# Altium footprint library PCBfly.PcbLib: 32 footprints (part 1 of 2)
Each footprint in its own frame and in the unit in brackets; x right, y up, seen from the top. Pads: shape width x height; smd on the part's side, far side on the other; paste and mask are expansions set on the pad; w line width, h text height; cw(c..) or ccw(c..) is an arc to the next point about the centre after c.
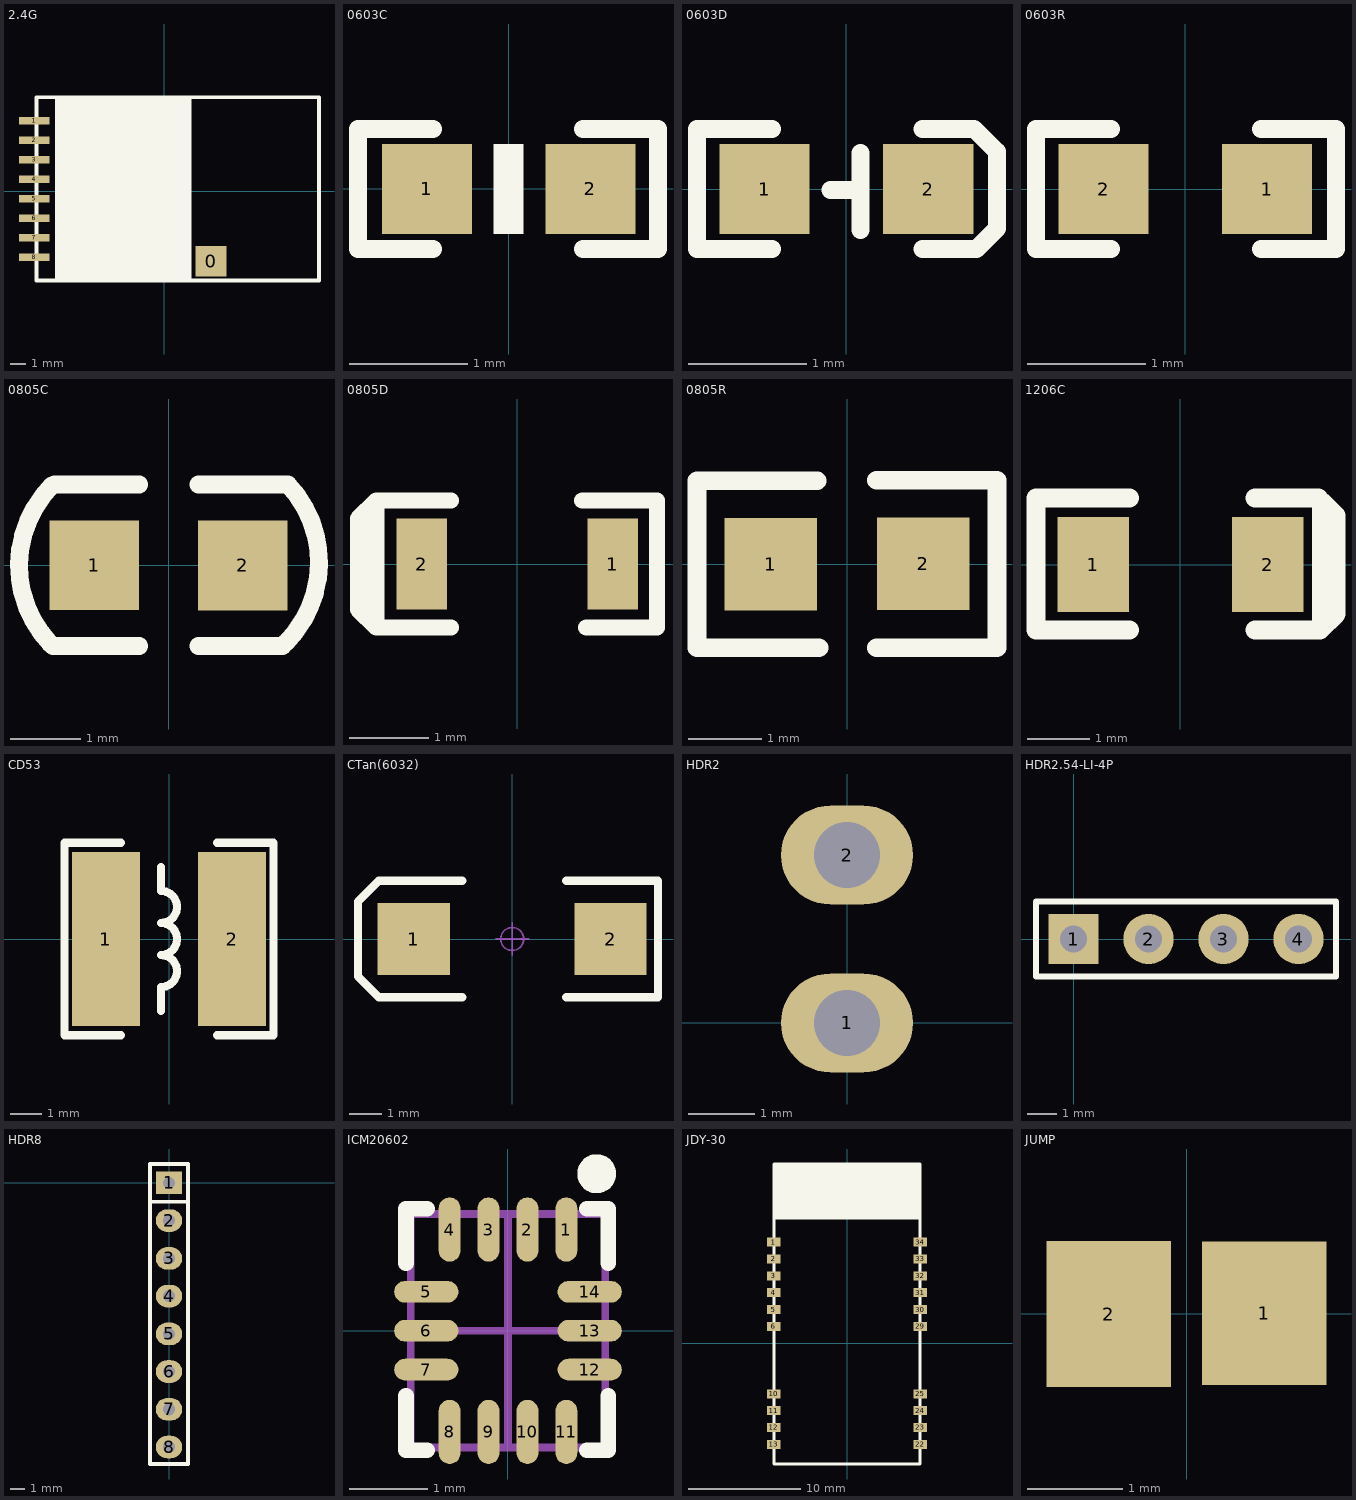
[diagram p0: the footprints below, top view; thin cyan lines are the x and y axes]

## 2.4G [mm]
pads (9):
  rect 2x2 smd: 0(3.048,-4.572)
  rect 2x0.5 smd: 1(-8.46,4.581) 2(-8.46,3.311) 3(-8.46,2.041) 4(-8.46,0.771) 5(-8.46,-0.499) 6(-8.46,-1.769) 7(-8.46,-3.039) 8(-8.46,-4.309)
Top Overlay:
  rectangle: -7.112,-5.842 1.778,6.096
  lines w0.254: -8.333,-5.833 10.082,-5.833 10.082,6.105 -8.333,6.105 -8.333,-5.833
3D body "nrf24l01.step": height 0.8, standoff 0, extent -8.509,-5.817 9.491,6.183

## 0603C [mil]
pads (2):
  rect 30x30 smd: 1(-27.25,0.03) 2(27.25,-0.03)
Top Overlay:
  region: 4.9,-15 4.9,15 -5.1,15 -5.1,-15
  lines w6: -25.25,-20.03 -50.25,-20.03 -50.25,19.97 -25.25,19.97 ; 24.75,-20.03 49.75,-20.03 49.75,19.97 24.75,19.97
3D body "0603 SMD Capacitor.STEP": height 11.89, standoff 0, extent -30.74,-14.6 32.25,16.9

## 0603D [mil]
pads (2):
  rect 30x30 smd: 1(-27.25,0.03) 2(27.25,-0.03)
Top Overlay:
  lines w6: -24.75,-19.97 -49.75,-19.97 -49.75,20.03 -24.75,20.03 ; -5.26,-0.24 2.5,-0.35 ; 4.66,-13.53 4.66,12.06 ; 25.25,-19.97 43.31,-19.97 50.13,-13.14 50.13,12.45 42.55,20.03 25.25,20.03
3D body "16.STEP": height 23.82, standoff -0.04, extent -31.5,-15 31.5,16.58

## 0603R [mil]
pads (2):
  rect 30x30 smd: 1(27.25,-0.03) 2(-27.25,0.03)
Top Overlay:
  lines w6: -24.75,-19.97 -49.75,-19.97 -49.75,20.03 -24.75,20.03 ; 25.25,-19.97 50.25,-19.97 50.25,20.03 25.25,20.03
3D body "RES0603.STEP": height 17.72, standoff 0, extent -27.99,-18 35,14.29

## 0805C [mm]
pads (2):
  rect 1.27x1.27 smd: 1(-1.05,0.001) 2(1.05,-0.001)
Top Overlay:
  lines w0.254: -1.677,-1.108 cw(c-0.511,-0.001) -1.652,1.132 ; -1.64,-1.142 -0.415,-1.142 ; -1.617,1.144 -0.415,1.144 ; 0.423,-1.142 1.617,-1.142 ; 0.423,1.144 1.67,1.144 ; 1.665,-1.092 ccw(c0.524,0.04) 1.693,1.144
3D body "User Library-0805 SMD Capacitor.STEP": height 0.77, standoff -0.01, extent -1.001,-0.621 0.999,0.629

## 0805D [mil]
pads (2):
  rect 25x45 smd: 1(47.19,0) 2(-47.19,0)
Top Overlay:
  lines w8: -74.79,-23.46 -74.79,21.54 ; -32.79,-31.46 -69.79,-31.46 ; -32.79,31.54 -69.79,31.54 ; 32.21,31.54 69.21,31.54 69.21,-31.46 34.21,-31.46 ; -69.79,-31.46 -78.79,-22.46 -78.79,22.54 -69.79,31.54 ; -69.79,-31.46 -69.79,31.54
3D body "SOD323.STEP": height 35.43, standoff -3.54, extent -49,-24.46 49.42,24.75

## 0805R [mm] "1/8W"
pads (2):
  rect 1.27x1.27 smd: 1(-1.045,-0.003) 2(1.045,0.003)
Top Overlay:
  lines w0.254: -0.41,1.14 -2.056,1.14 -2.056,-1.146 -0.385,-1.146 ; 0.403,-1.146 2.054,-1.146 2.054,1.146 0.403,1.146
3D body "R0805.STEP": height 0.55, standoff 0, extent -1.009,-0.622 0.991,0.638

## 1206C [mil]
pads (2):
  rect 45x60 smd: 1(-55,0) 2(55,0)
Top Overlay:
  lines w12: -32,-41.19 -91,-41.19 -91,41.81 -32,41.81 ; 47,-41.19 88,-41.19 98,-31.18 98,30.82 89,39.81 89,-40.19 ; 47,41.81 87,41.81
3D body "3216-_A_钽电容.step": height 70.87, standoff 0, extent -66.93,-33.55 66.93,37.31

## CD53 [mm] "5.8*5.2*3.5mm（长宽高）"
pads (2):
  rect 2.15x5.5 smd: 1(-2,0) 2(2,0)
Top Overlay:
  lines w0.254: -1.524,-3.048 -3.302,-3.048 -3.302,3.048 -1.524,3.048 ; -0.254,-2.286 -0.254,-1.524 ccw(c-0.254,-1.016) -0.254,-0.508 ccw(c-0.254,0) -0.254,0.508 ccw(c-0.254,1.016) -0.254,1.524 -0.254,2.286 ; 1.524,-3.048 3.302,-3.048 3.302,3.048 1.524,3.048
3D body "CD53.STEP": height 3.6, standoff 0, extent -2.874,-2.5 2.874,2.5

## CTan(6032) [mm] "长6.0mm，宽3.2mm，厚2.5mm"
pads (2):
  rect 2.2x2.2 smd: 1(-3,0) 2(3,0)
Top Overlay:
  lines w0.254: -1.524,-1.778 -4.064,-1.778 -4.699,-1.143 -4.699,1.143 -4.064,1.778 -1.524,1.778 ; 1.651,-1.778 4.445,-1.778 4.445,1.778 1.651,1.778
Mechanical 15:
  circle w0.05: c0,0 r0.35
  lines w0.05: -0.5,0 0.5,0 ; 0,-0.5 0,0.5
3D body "CD C(6032).STEP": height 2.5, standoff -0.01, extent -3,-1.6 3,1.6

## HDR2 [mm]
pads (2):
  oval 2x1.5 hole 1: 1(0,0) 2(0,2.54)
3D body "hdr2.stp": height 2.54, standoff -1, extent -0.361,-1.279 9.989,3.801

## HDR2.54-LI-4P [mm] "排针，4脚"
pads (4):
  rect 1.7x1.7 hole 0.9: 1(0,0)
  round 1.7 hole 0.9: 2(2.54,0) 3(5.08,0) 4(7.62,0)
Top Overlay:
  lines w0.2: -1.27,-1.27 8.89,-1.27 8.89,1.27 -1.27,1.27 -1.27,-1.27
3D body "HDR2.54-1P.STEP": height 8.5, standoff -3, extent 6.35,-1.27 8.89,1.27
3D body "HDR2.54-1P.STEP": height 8.5, standoff -3, extent 3.81,-1.27 6.35,1.27
3D body "HDR2.54-1P.STEP": height 8.5, standoff -3, extent 1.27,-1.27 3.81,1.27
3D body "HDR2.54-1P.STEP": height 8.5, standoff -3, extent -1.27,-1.27 1.27,1.27

## HDR8 [mil]
pads (8):
  rect 70x60 hole 32: 1(0,0)
  oval 70x60 hole 32: 2(0,-100) 3(0,-200) 4(0,-300) 5(0,-400) 6(0,-500) 7(0,-600) 8(0,-700)
Top Overlay:
  lines w10: -50,-50 50,-50 ; -50,-745 50,-745 50,50 -50,50 -50,-745
3D body "1001-8.STEP": height 336.22, standoff -118.11, extent -50,-750 50,50

## ICM20602 [mm]
pads (14):
  oval 0.28x0.825 smd mask+0.051: 1(0.75,1.3) 2(0.25,1.3) 3(-0.25,1.3) 4(-0.75,1.3) 8(-0.75,-1.3) 9(-0.25,-1.3) 10(0.25,-1.3) 11(0.75,-1.3)
  oval 0.825x0.28 smd mask+0.051: 5(-1.05,0.5) 6(-1.05,0) 7(-1.05,-0.5) 12(1.05,-0.5) 13(1.05,0) 14(1.05,0.5)
Top Overlay:
  circle w0.25: c1.139,2.017 r0.125
  lines w0.2: -1.311,-0.833 -1.311,-1.533 -1.036,-1.533 ; -1.311,0.867 -1.311,1.567 -1.036,1.567 ; 1.014,-1.533 1.289,-1.533 1.289,-0.833 ; 1.014,1.567 1.289,1.567 1.289,0.867
Mechanical 13:
  lines w0.1: -1.25,0 1.25,0 ; 0,-1.5 0,1.5 ; -1.25,-1.5 1.25,-1.5 1.25,1.5 -1.25,1.5 -1.25,-1.5
3D body "User Library-LGA-14 2_5x3-1.step": height 0.8, standoff -0.06, extent -1.25,-1.5 1.25,1.5

## JDY-30 [mm]
pads (20):
  rect 1.2x0.8 smd: 1(-6.5,9) 2(-6.5,7.5) 3(-6.5,6) 4(-6.5,4.5) 5(-6.5,3) 6(-6.5,1.5) 10(-6.5,-4.5) 11(-6.5,-6) 12(-6.5,-7.5) 13(-6.5,-9) 22(6.5,-9) 23(6.5,-7.5) 24(6.5,-6) 25(6.5,-4.5) 29(6.5,1.5) 30(6.5,3) 31(6.5,4.5) 32(6.5,6) 33(6.5,7.5) 34(6.5,9)
Top Overlay:
  rectangle: -6.5,11.15 6.5,15.95
  lines w0.254: -6.5,11.15 6.5,11.15 ; -6.5,-10.75 -6.5,15.95 6.5,15.95 6.5,-10.75 -6.5,-10.75
3D body "User Library-HC05(06).step": height 4.31, standoff 0, extent -6.551,-10.781 6.449,16.219

## JUMP [mm]
pads (2):
  rect 1.3x1.5 smd: 1(0.814,0.004)
  rect 1.3x1.524 smd: 2(-0.814,-0.003)